# Altium footprint library En.PcbLib: 240 footprints (part 11 of 15)
Each footprint in its own frame and in the unit in brackets; x right, y up, seen from the top. Pads: shape width x height; smd on the part's side, far side on the other; paste and mask are expansions set on the pad; w line width, h text height; cw(c..) or ccw(c..) is an arc to the next point about the centre after c.
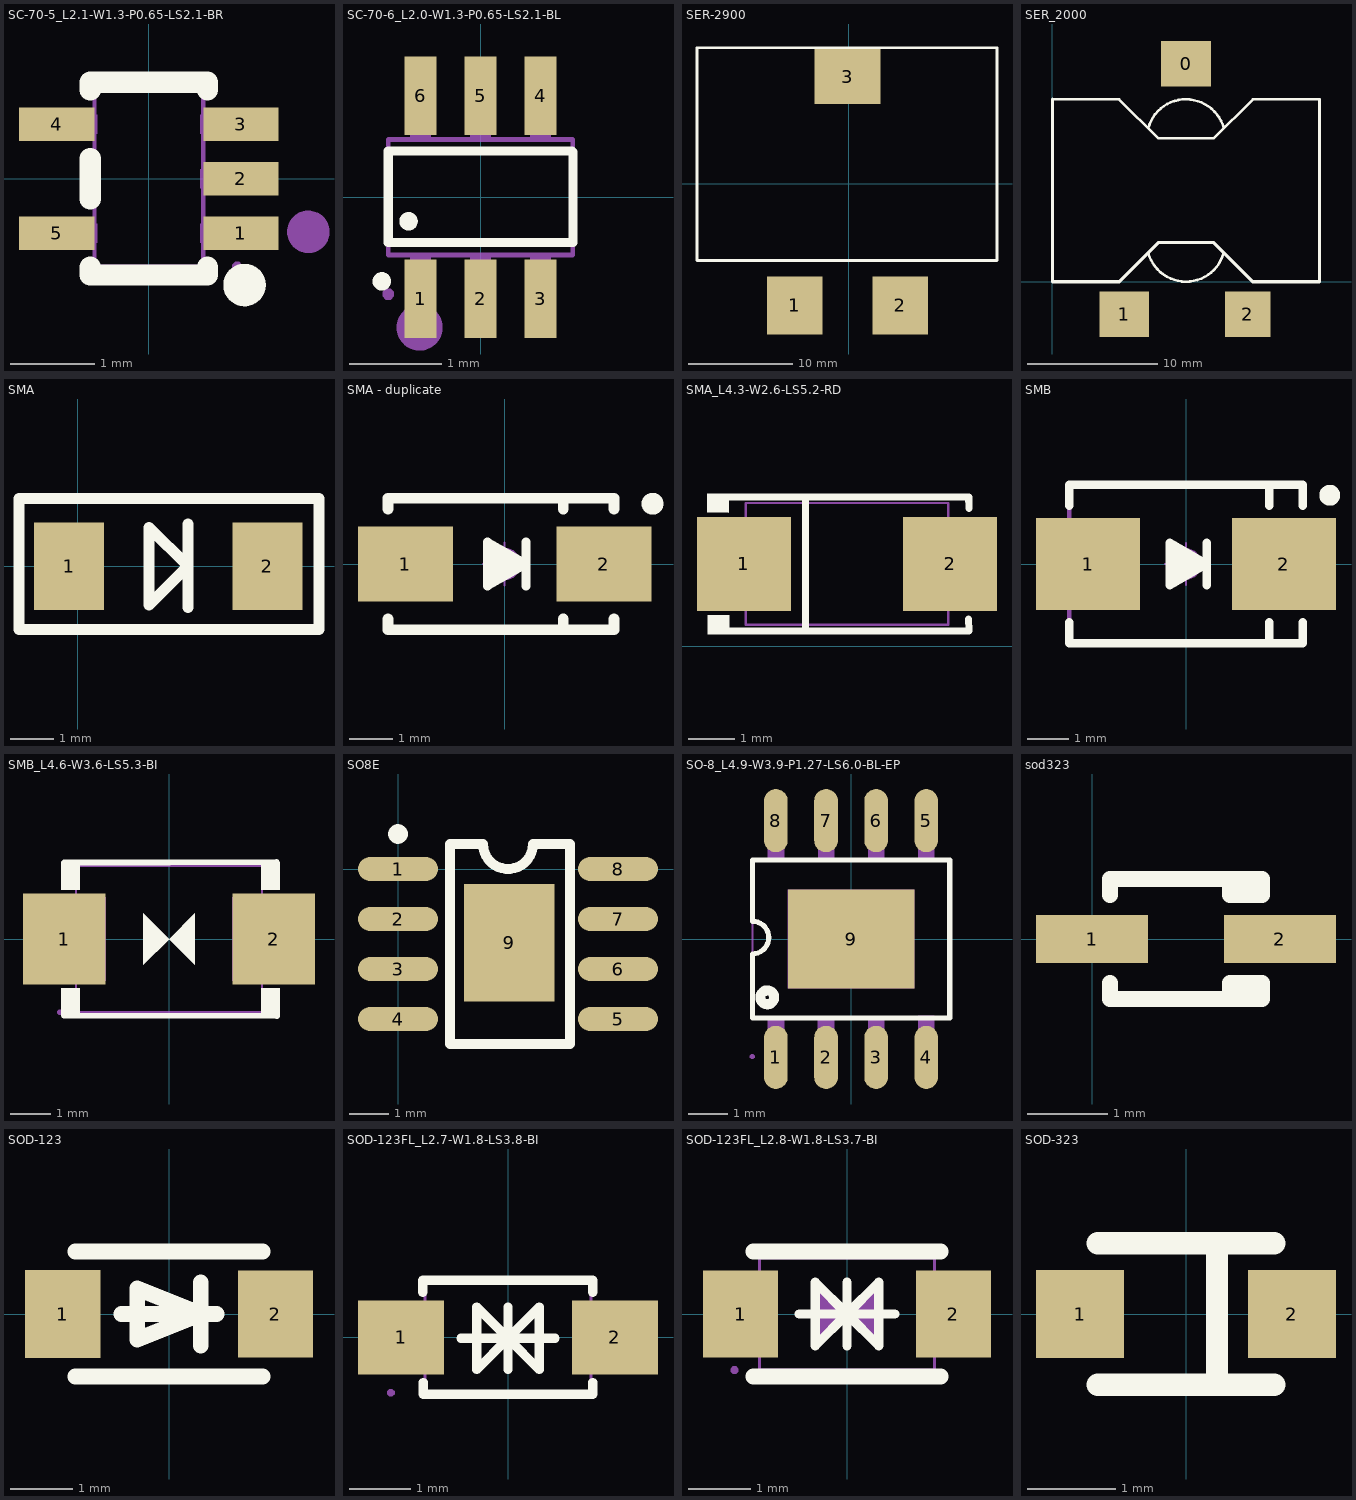
[diagram p10: the footprints below, top view; thin cyan lines are the x and y axes]

## SC-70-5_L2.1-W1.3-P0.65-LS2.1-BR [mm]
pads (5):
  rect 0.9x0.4 smd: 1(1.1,-0.65) 2(1.1,0) 3(1.1,0.65) 4(-1.1,0.65) 5(-1.1,-0.65)
Top Overlay:
  circle w0.254: c1.143,-1.27 r0.127
  lines w0.254: -0.7,-1.058 -0.7,-1.15 0.7,-1.15 0.7,-1.058 ; -0.7,-0.242 -0.7,0.242 ; -0.7,1.058 -0.7,1.15 0.7,1.15 0.7,1.058
Mechanical 6:
  circle w0.254: c1.905,-0.635 r0.127
Mechanical 15:
  region: 1.113,-1.052 1.112,-1.028 1.077,-0.995 1.029,-0.995 0.994,-1.028 0.993,-1.052 0.994,-1.076 1.029,-1.109 1.077,-1.109 1.112,-1.076
  region: 0.615,-0.763 0.615,-0.538 0.7,-0.538 0.7,-0.763
  region: 0.69,-0.763 0.69,-0.538 1.05,-0.538 1.05,-0.763
  region: 0.615,-0.113 0.615,0.112 0.7,0.112 0.7,-0.113
  region: 0.69,-0.113 0.69,0.112 1.05,0.112 1.05,-0.113
  region: 0.615,0.537 0.615,0.762 0.7,0.762 0.7,0.537
  region: 0.69,0.537 0.69,0.762 1.05,0.762 1.05,0.537
  region: -0.7,0.537 -0.7,0.762 -0.615,0.762 -0.615,0.537
  region: -1.05,0.537 -1.05,0.762 -0.69,0.762 -0.69,0.537
  region: -0.7,-0.763 -0.7,-0.538 -0.615,-0.538 -0.615,-0.763
  region: -1.05,-0.763 -1.05,-0.538 -0.69,-0.538 -0.69,-0.763
  lines w0.051: -0.65,-1.05 -0.65,1.05 0.65,1.05 0.65,-1.05 -0.65,-1.05
3D body "sn74lvc1g08dckr-ms.step": height 0.98, standoff -0.02, extent -1.05,-1 1.05,1

## SC-70-6_L2.0-W1.3-P0.65-LS2.1-BL [mm]
pads (6):
  rect 0.35x0.85 smd paste+0 mask+0.05: 1(-0.65,-1.1) 2(0,-1.1) 3(0.65,-1.1) 4(0.65,1.1) 5(0,1.1) 6(-0.65,1.1)
Top Overlay:
  circle w0.1: c-1.07,-0.91 r0.05
  circle w0.1: c-0.78,-0.26 r0.05
  lines w0.1: -1,-0.49 -1,0.5 0.99,0.5 1,0.49 1,-0.49 -1,-0.49
Mechanical 6:
  circle w0.25: c-0.66,-1.41 r0.125
Mechanical 15:
  region: -0.94,-1.05 -0.941,-1.026 -0.976,-0.991 -1.024,-0.991 -1.059,-1.026 -1.06,-1.05 -1.059,-1.075 -1.024,-1.109 -0.976,-1.109 -0.941,-1.075
  region: -0.763,0.615 -0.763,0.7 -0.538,0.7 -0.538,0.615
  region: -0.763,0.69 -0.763,1.05 -0.538,1.05 -0.538,0.69
  region: -0.112,0.615 -0.112,0.7 0.112,0.7 0.112,0.615
  region: -0.112,0.69 -0.112,1.05 0.112,1.05 0.112,0.69
  region: 0.538,0.615 0.538,0.7 0.763,0.7 0.763,0.615
  region: 0.538,0.69 0.538,1.05 0.763,1.05 0.763,0.69
  region: -0.763,-0.7 -0.763,-0.615 -0.538,-0.615 -0.538,-0.7
  region: -0.763,-1.05 -0.763,-0.69 -0.538,-0.69 -0.538,-1.05
  region: -0.112,-0.7 -0.112,-0.615 0.112,-0.615 0.112,-0.7
  region: -0.112,-1.05 -0.112,-0.69 0.112,-0.69 0.112,-1.05
  region: 0.538,-0.7 0.538,-0.615 0.763,-0.615 0.763,-0.7
  region: 0.538,-1.05 0.538,-0.69 0.763,-0.69 0.763,-1.05
  lines w0.051: -1,-0.625 -1,0.625 1,0.625 1,-0.625 -1,-0.625
3D body "lm66100dckr_c2869734.step": height 0.96, standoff 0.01, extent -1,-1.05 1,1.05

## SER-2900 [mm]
pads (3):
  rect 5.33x5.59 smd: 1(-5.202,-11.684) 2(4.948,-11.684)
  rect 6.35x5.28 smd: 3(-0.127,10.316)
Top Overlay:
  lines w0.254: -14.605,-7.366 -14.605,13.081 14.224,13.081 14.224,-7.366 -14.605,-7.366
3D body "Coilcraft-SER2915H.SLDPRT": height 15.34, standoff -0.02, extent -13.951,-13.869 13.951,13.172

## SER_2000 [mm]
pads (3):
  rect 3.8x3.5 smd: 0(10.25,16.725) 1(5.5,-2.5)
  rect 3.5x3.5 smd: 2(15,-2.5)
Top Overlay:
  lines w0.2: 0,14 5.125,14 8.125,11 12.375,11 15.375,14 20.5,14 20.5,0 ; 7.351,2.226 ccw(c10.25,3) 13.141,2.197 ; 7.356,11.791 cw(c10.25,11) 13.149,11.774
  lines w0.254: 0,14 0,0 5.125,0 8.125,3 12.375,3 15.375,0 20.5,0
3D body "Coilcraft-SER2011.SLDPRT": height 10.42, standoff -0.25, extent 0.376,-2.238 20.066,16.462

## SMA [mil] "DO-214AC(2010)"
pads (2):
  rect 63x78.74 smd: 1(-8,0) 2(170.56,0)
Top Overlay:
  lines w10: 99,-37 99,38 ; -53,-57 -53,61 217,61 217,-57 -53,-57 ; 64,-35 64,35 99,0 64,-35
3D body "DO-214AC.STEP": height 94.49, standoff 0, extent -7.55,-52.15 173.55,54.15

## SMA - duplicate [mm] "4.5x2.6*2.2mm（长宽高，不包括引脚）"
height 2.54
pads (2):
  rect 2.2x1.75 smd: 1(-2.3,0) 2(2.3,0)
Top Overlay:
  circle w0.254: c3.429,1.397 r0.127
  lines w0.203: 0.494,-0.508 0.494,0.508 ; -0.395,-0.508 0.494,0 -0.395,0.508 -0.395,-0.508
  lines w0.254: -2.7,-1.27 -2.7,-1.524 2.54,-1.524 2.54,-1.27 ; -2.7,1.27 -2.7,1.524 2.54,1.524 2.54,1.27 ; -0.33,0.305 0.305,0 -0.254,-0.305 -0.254,0.051 0.023,0 ; 1.359,-1.486 1.359,-1.27 ; 1.359,1.27 1.359,1.397
Mechanical 15:
  circle w0.05: c0,0 r0.35
  lines w0.05: -0.5,0 0.5,0 ; 0,-0.5 0,0.5
3D body "SMA.STEP": height 2.15, standoff 0.04, extent -2.528,-1.3 2.575,1.3

## SMA_L4.3-W2.6-LS5.2-RD [mm]
pads (2):
  rect 2x2 smd: 1(15.097,1.757) 2(19.497,1.757)
Top Overlay:
  region: 14.785,0.661 14.784,0.254 14.324,0.259 14.328,0.661
  region: 14.777,3.259 14.776,2.852 14.316,2.857 14.32,3.259
  lines w0.152: 14.701,0.33 19.893,0.33 ; 14.701,3.183 19.893,3.183 19.9,2.944 ; 16.413,0.33 16.413,3.183 ; 19.89,0.581 19.897,0.342
Mechanical 6:
  region: 19.311,1.082 19.311,2.432 19.108,2.432 19.108,1.082
  region: 19.587,1.667 19.587,1.869 18.777,1.869 18.777,1.667
  region: 14.979,1.655 14.979,1.858 15.789,1.858 15.789,1.655
Mechanical 15:
  region: 15.817,2.482 15.817,1.032 14.692,1.032 14.692,2.482
  region: 19.902,2.481 19.902,1.031 18.777,1.031 18.777,2.481
  region: 14.752,0.457 14.751,0.481 14.716,0.515 14.667,0.515 14.632,0.481 14.632,0.457 14.632,0.432 14.667,0.398 14.716,0.398 14.751,0.432
  lines w0.051: 15.137,0.457 19.457,0.457 19.457,3.057 15.137,3.057 15.137,0.457
3D body "SMA.STEP": height 2.15, standoff 0.04, extent 14.593,0.478 19.696,3.078

## SMB [mm] "4.7*3.9*2.2mm(长宽高，不包括引脚）"
height 2.4
pads (2):
  rect 2.5x2.2 smd: 1(-2.35,0) 2(2.35,0)
Top Overlay:
  circle w0.25: c3.45,1.65 r0.125
  lines w0.2: -2.8,-1.4 -2.8,-1.9 2.8,-1.9 2.8,-1.4 ; -2.8,1.4 -2.8,1.9 2.8,1.9 2.8,1.4 ; 2,-1.9 2,-1.4 ; 2,1.4 2,1.9
  lines w0.203: 0.5,-0.508 0.5,0.508 ; -0.389,-0.508 0.5,0 -0.389,0.508 -0.389,-0.508
  lines w0.254: -0.254,0 0.279,0 ; 0.279,0 -0.229,-0.305 -0.229,0.279 0.279,0
Mechanical 13:
  lines w0.1: 2.8,-1.9 -2.8,-1.9 -2.8,1.9 2.8,1.9
Mechanical 15:
  circle w0.05: c0,0 r0.35
  lines w0.05: -0.5,0 0.5,0 ; 0,-0.5 0,0.5
3D body "SMB.STEP": height 2.35, standoff 0.04, extent -2.628,-1.8 2.675,1.8

## SMB_L4.6-W3.6-LS5.3-BI [mm]
pads (2):
  rect 2.047x2.241 smd: 1(-2.591,0) 2(2.591,0)
Top Overlay:
  region: -0.635,-0.635 -0.635,0.635 0,0
  region: 0.635,-0.635 0,0 0.635,0.635
  region: -2.667,-1.905 -2.667,-1.215 -2.21,-1.215 -2.21,-1.905
  region: -2.667,1.905 -2.667,1.215 -2.21,1.215 -2.21,1.905
  region: 2.286,1.905 2.286,1.215 2.743,1.215 2.743,1.905
  region: 2.286,-1.905 2.286,-1.215 2.743,-1.215 2.743,-1.905
  lines w0.152: -2.599,-1.89 2.667,-1.905 ; -2.591,1.887 2.663,1.905
Mechanical 15:
  region: -2.708,1.037 -2.708,-1.037 -1.568,-1.037 -1.568,1.037
  region: 2.708,1.037 2.708,-1.037 1.568,-1.037 1.568,1.037
  region: -2.648,-1.81 -2.648,-1.785 -2.683,-1.75 -2.733,-1.75 -2.768,-1.785 -2.768,-1.81 -2.768,-1.835 -2.733,-1.87 -2.683,-1.87 -2.648,-1.835
  lines w0.051: -2.3,-1.81 -2.3,1.81 2.3,1.81 2.3,-1.81 -2.3,-1.81
3D body "p6smb30ca_c80384.step": height 2.1, standoff 0, extent -2.7,-1.8 2.7,1.8

## SO8E [mil]
pads (9):
  oval 80x24 smd: 1(0,0) 2(0,-50) 3(0,-100) 4(0,-150) 5(220,-150) 6(220,-100) 7(220,-50) 8(220,0)
  rect 90.55x117.72 smd: 9(111.23,-73.8)
Top Overlay:
  circle w9.84: c0,35 r4.92
  lines w10: 52,-175 52,25 85,25 ccw(c110,25) 135,25 172,25 172,-175 52,-175
3D body "SOP8.STEP": height 62.99, standoff 0, extent -7.7,-172.62 230.17,25.02

## SO-8_L4.9-W3.9-P1.27-LS6.0-BL-EP [mil]
pads (9):
  oval 23.6x63 smd mask+2: 1(-75,-118.1) 2(-25,-118.1) 3(25,-118.1) 4(75,-118.1) 5(75,118.1) 6(25,118.1) 7(-25,118.1) 8(-75,118.1)
  rect 126x98.4 smd mask+2: 9(0,0)
Top Overlay:
  circle w10: c-83.6,-58.2 r6.9
  lines w5.1: -98.4,-78.7 -98.4,-14.8 ccw(c-98.41,1.46) -98.42,17.71 -98.4,78.7 98.4,78.7 98.4,-78.7 -98.4,-78.7
Mechanical 6:
  circle w7.9: c-74.7,-127.4 r3.9
Mechanical 15:
  region: 83.1,101.6 66.9,101.6 66.9,117.3 83.1,117.3
  region: 83.1,77.2 66.9,77.2 66.9,101.7 83.1,101.7
  region: 33.1,102.3 16.9,102.3 16.9,118 33.1,118
  region: 33.2,78 17,78 17,102.5 33.2,102.5
  region: -16.9,102.6 -33.1,102.6 -33.1,118.3 -16.9,118.3
  region: -16.8,78.3 -33,78.3 -33,102.8 -16.8,102.8
  region: -66.9,101.5 -83.1,101.5 -83.1,117.2 -66.9,117.2
  region: -66.9,77.2 -83.1,77.2 -83.1,101.7 -66.9,101.7
  region: 83.1,-116.6 66.9,-116.6 66.9,-100.9 83.1,-100.9
  region: 83.1,-101.1 66.9,-101.1 66.9,-76.7 83.1,-76.7
  region: 33.1,-116.9 16.9,-116.9 16.9,-101.2 33.1,-101.2
  region: 33.1,-101.3 16.9,-101.3 16.9,-76.9 33.1,-76.9
  region: -16.9,-117 -33.1,-117 -33.1,-101.3 -16.9,-101.3
  region: -16.9,-101.4 -33.1,-101.4 -33.1,-77 -16.9,-77
  region: -66.9,-116.9 -83.1,-116.9 -83.1,-101.2 -66.9,-101.2
  region: -66.9,-101.3 -83.1,-101.3 -83.1,-76.9 -66.9,-76.9
  region: -63,49.2 63,49.2 63,-49.2 -63,-49.2
  region: -96.3,-117.2 -96.3,-116.21 -97.71,-114.8 -99.69,-114.8 -101.1,-116.21 -101.1,-117.2 -101.1,-118.19 -99.69,-119.6 -97.71,-119.6 -96.3,-118.19 -96.3,-117.2
  lines w2: -98.4,-77.6 -98.4,79.9 98.4,79.9 98.4,-77.6 -98.4,-77.6
3D body "SOP8.STEP": height 62.99, standoff 0, extent -98.82,-112.87 98.82,125

## sod323 [mm]
pads (2):
  rect 1.4x0.6 smd: 1(0,0) 2(2.35,0)
Top Overlay:
  lines w0.2: 0.225,-0.55 0.225,-0.75 2.125,-0.75 2.125,-0.55 1.725,-0.55 1.725,-0.75 ; 0.225,0.55 0.225,0.75 2.125,0.75 2.125,0.55 1.725,0.55 1.725,0.75
3D body "SOD-323.STEP": height 1, standoff 0, extent -0.169,-0.667 2.431,0.633

## SOD-123 [mm]
pads (2):
  rect 1.2x1.4 smd: 1(-1.7,0) 2(1.7,0)
Top Overlay:
  lines w0.254: -1.5,-1 1.5,-1 ; -1.5,1 1.5,1 ; -0.762,0 0.762,0 ; 0.508,-0.508 0.508,0.508 ; -0.508,-0.406 0.508,0 -0.508,0.406 -0.508,-0.406
3D body "User Library-SOD123-1.STEP": height 1.18, standoff 0, extent -1.95,-0.9 1.95,0.9

## SOD-123FL_L2.7-W1.8-LS3.8-BI [mm]
pads (2):
  rect 1.4x1.2 smd: 1(-1.735,0) 2(1.735,0)
Top Overlay:
  lines w0.15: -0.762,-0.016 0.762,-0.016 ; 0,-0.524 0,0.492 ; 0,-0.27 0,0.238 ; 0,-0.016 -0.508,0.492 -0.508,-0.524 0,-0.016 ; 0,-0.016 0.508,-0.524 0.508,0.492 0,-0.016
  lines w0.152: -1.382,0.732 -1.382,0.925 ; -1.377,-0.927 -1.377,-0.734 ; -1.376,-0.926 1.376,-0.926 1.376,-0.733 ; -1.376,0.926 1.376,0.926 1.376,0.733
Mechanical 15:
  region: -1.842,-0.9 -1.842,-0.876 -1.877,-0.842 -1.926,-0.842 -1.961,-0.876 -1.962,-0.9 -1.961,-0.924 -1.926,-0.958 -1.877,-0.958 -1.842,-0.924
  region: -1.902,0.475 -1.102,0.475 -1.102,-0.475 -1.902,-0.475
  region: 1.902,-0.475 1.102,-0.475 1.102,0.475 1.902,0.475
  lines w0.051: -1.35,-0.9 -1.35,0.9 1.35,0.9 1.35,-0.9 -1.35,-0.9
3D body "smf5.0ca_c19077498.step": height 1.08, standoff -0.03, extent -1.875,-0.875 1.875,0.875

## SOD-123FL_L2.8-W1.8-LS3.7-BI [mm]
pads (2):
  rect 1.2x1.4 smd: 1(-1.7,0) 2(1.7,0)
Top Overlay:
  lines w0.15: -0.762,0 0.762,0 ; 0,-0.508 0,0.508 ; 0,-0.254 0,0.254 ; 0,0 0.508,0.508 0.508,-0.508 0,0 ; 0,0 -0.508,-0.508 -0.508,0.508 0,0
  lines w0.254: -1.5,-1 1.5,-1 ; -1.5,1 1.5,1
Mechanical 6:
  region: -0.5,0.5 -0.5,-0.5 0,0
  region: 0.5,-0.5 0.5,0.5 0,0
Mechanical 15:
  region: -1.8,0.5 -1.275,0.5 -1.275,-0.5 -1.8,-0.5
  region: 1.275,0.5 1.8,0.5 1.8,-0.5 1.275,-0.5
  region: -1.74,-0.9 -1.74,-0.875 -1.775,-0.84 -1.825,-0.84 -1.86,-0.875 -1.86,-0.9 -1.86,-0.925 -1.825,-0.96 -1.775,-0.96 -1.74,-0.925
  lines w0.051: -1.4,-0.9 1.4,-0.9 1.4,0.9 -1.4,0.9 -1.4,-0.9
3D body "smf12ca_c1851360.step": height 1.15, standoff 0.01, extent -1.85,-0.9 1.85,0.9

## SOD-323 [mm]
height 9.4
pads (2):
  rect 1x1 smd: 1(-1.2,0) 2(1.2,0)
Top Overlay:
  lines w0.254: -1,-0.8 1,-0.8 ; -1,0.8 1,0.8 ; 0.351,-0.8 0.351,0.8
3D body "SOD-323.STEP": height 1, standoff 0, extent -1.312,-0.667 1.288,0.633